# Altium footprint library Binh.PcbLib: 863 footprints (part 23 of 54)
Each footprint in its own frame and in the unit in brackets; x right, y up, seen from the top. Pads: shape width x height; smd on the part's side, far side on the other; paste and mask are expansions set on the pad; w line width, h text height; cw(c..) or ccw(c..) is an arc to the next point about the centre after c.
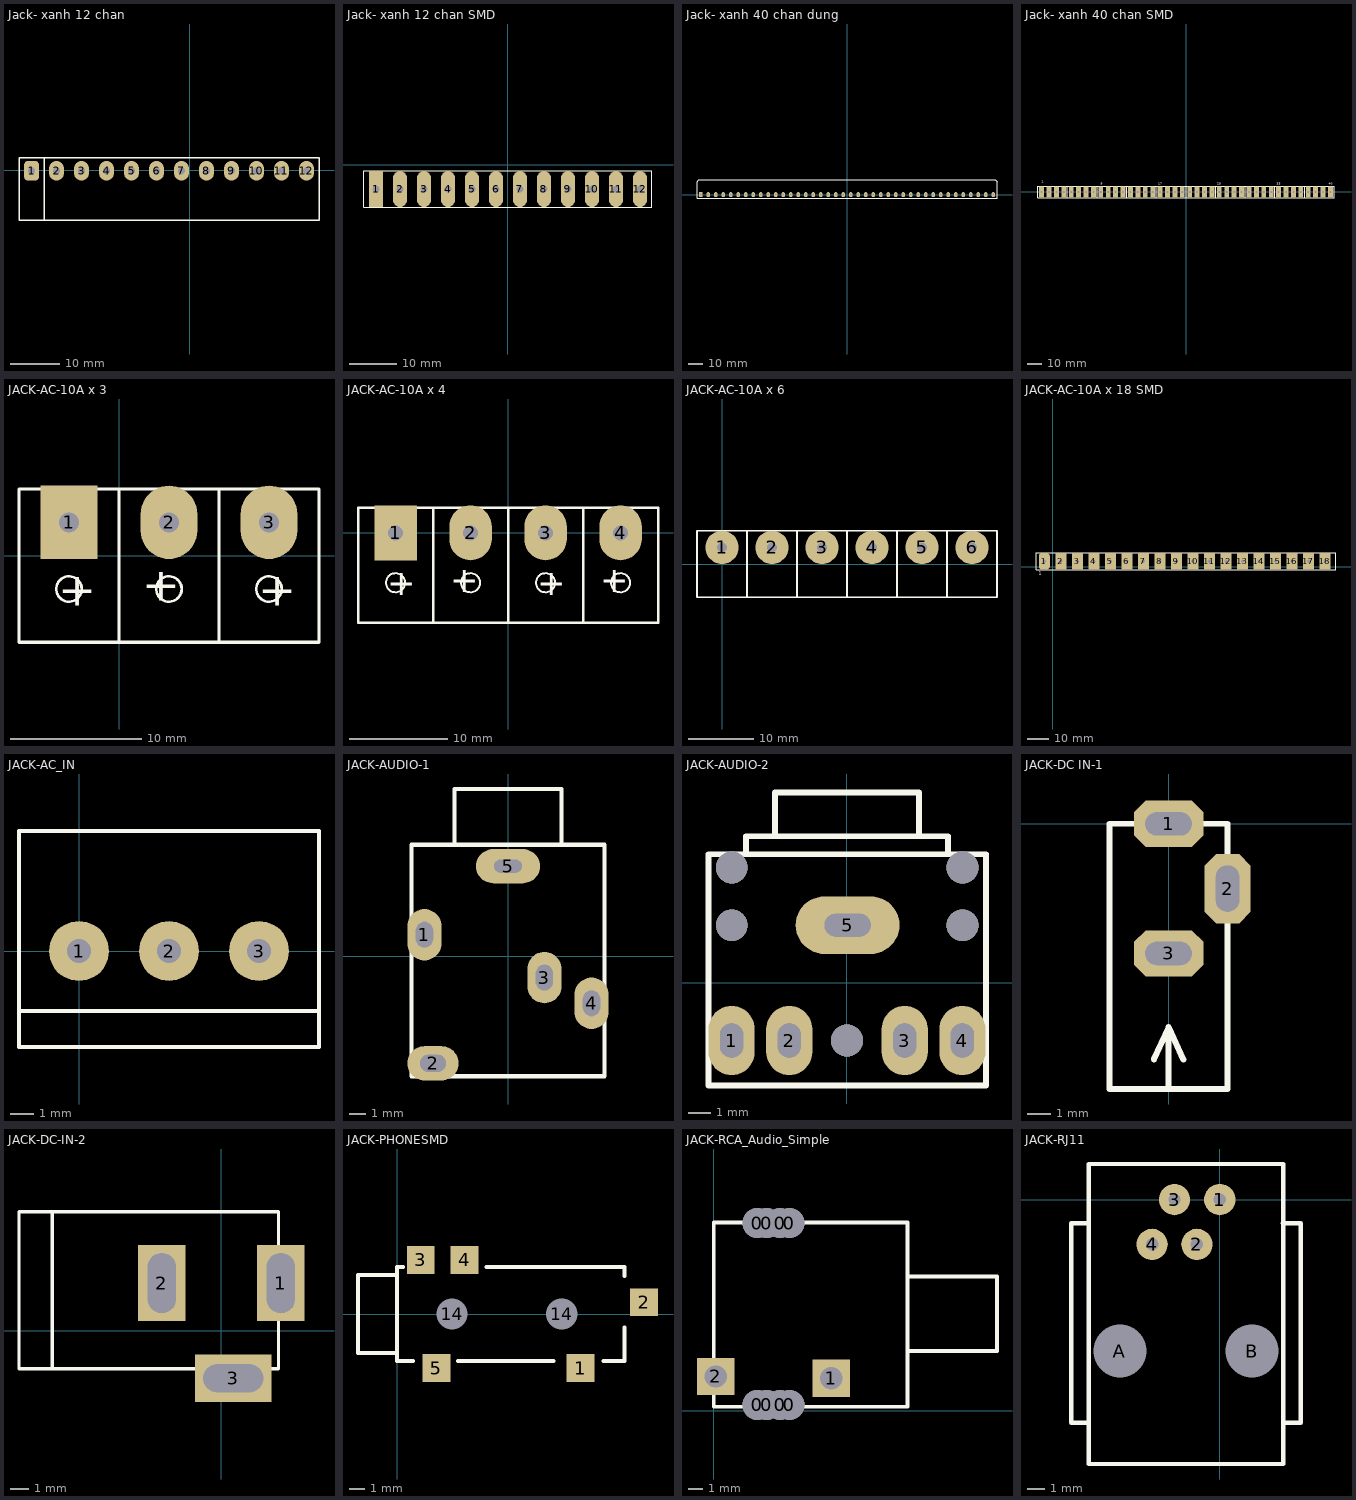
[diagram p22: the footprints below, top view; thin cyan lines are the x and y axes]

## Jack- xanh 12 chan [mm] "Jac xanh duc"
pads (12):
  rrect50% 3x4 hole 1.5: 1(-32.131,-0.127)
  oval 3x4 hole 1.5: 2(-27.063,-0.127) 3(-21.994,-0.127) 4(-16.926,-0.127) 5(-11.857,-0.127) 6(-6.789,-0.127) 7(-1.72,-0.127) 8(3.348,-0.127) 9(8.417,-0.127) 10(13.485,-0.127) 11(18.554,-0.127) 12(23.622,-0.127)
Top Overlay:
  lines w0.254: -29.591,-10.16 -29.591,2.413 ; -34.671,-10.16 -34.671,2.54 26.162,2.54 26.162,-10.16 -34.671,-10.16

## Jack- xanh 12 chan SMD [mm] "Jac xanh duc"
pads (12):
  rect 3x7.62 hole 1.5: 1(-27.871,-5.08)
  oval 3x7.62 hole 1.5: 2(-22.802,-5.08) 3(-17.734,-5.08) 4(-12.665,-5.08) 5(-7.597,-5.08) 6(-2.528,-5.08) 7(2.54,-5.08) 8(7.608,-5.08) 9(12.677,-5.08) 10(17.745,-5.08) 11(22.814,-5.08) 12(27.882,-5.08)
Top Overlay:
  lines w0.254: -30.422,-8.89 -30.422,-1.27 30.411,-1.27 30.411,-8.89 -30.422,-8.89

## Jack- xanh 40 chan dung [mil] "Jac xanh duc"
height 200
pads (40):
  rect 100x130 hole 50: 1(-3900,0)
  oval 100x130 hole 50: 2(-3700,0) 3(-3500,0) 4(-3300,0) 5(-3100,0) 6(-2900,0) 7(-2700,0) 8(-2500,0) 9(-2300,0) 10(-2100,0) 11(-1900,0) 12(-1700,0) 13(-1500,0) 14(-1300,0) 15(-1100,0) 16(-900,0) 17(-700,0) 18(-500,0) 19(-300,0) 20(-100,0) 21(100,0) 22(300,0) 23(500,0) 24(700,0) 25(900,0) 26(1100,0) 27(1300,0) 28(1500,0) 29(1700,0) 30(1900,0) 31(2100,0) 32(2300,0) 33(2500,0) 34(2700,0) 35(2900,0) 36(3100,0) 37(3300,0) 38(3500,0) 39(3700,0) 40(3900,0)
Top Overlay:
  lines w13: -4000,-100 4000,-100 4000,350 3950,400 -3950,400 -4000,350 -4000,-100

## Jack- xanh 40 chan SMD [mil] "Jac xanh duc"
pads (40):
  rect 130x300 hole 60: 1(-3900,0) 2(-3700,0) 3(-3500,0) 4(-3300,0) 5(-3100,0) 6(-2900,0) 7(-2700,0) 8(-2500,0) 9(-2300,0) 10(-2100,0) 11(-1900,0) 12(-1700,0) 13(-1500,0) 14(-1300,0) 15(-1100,0) 16(-900,0) 17(-700,0) 18(-500,0) 19(-300,0) 20(-100,0) 21(100,0) 22(300,0) 23(500,0) 24(700,0) 25(900,0) 26(1100,0) 27(1300,0) 28(1500,0) 29(1700,0) 30(1900,0) 31(2100,0) 32(2300,0) 33(2500,0) 34(2700,0) 35(2900,0) 36(3100,0) 37(3300,0) 38(3500,0) 39(3700,0) 40(3900,0)
Top Overlay:
  lines w10: -3200,-150 -3200,150 ; -2400,-150 -2400,150 ; -800,-150 -800,150 ; 0,-150 0,150 ; 800,-150 800,150 ; 1600,-150 1600,150 ; 2400,-150 2400,150 ; 3200,-150 3200,150 ; -1602.73,-150 4000,-150 4000,150 -1602.73,150 ; -1602.73,-150 -1602.73,150 ; -1602.73,-150 -3997.73,-150 -3997.73,150 -1602.73,150
  text "40" at 3850,200 h60
  text "33" at 2450,200 h60
  text "25" at 850,200 h60
  text "17" at -750,200 h60
  text "9" at -2300,200 h60
  text "1" at -3900,250 h60

## JACK-AC-10A x 3 [mil] "Jac nguon 220V 10A"
pads (3):
  rect 170x220 hole 60: 1(-150,100)
  oval 170x220 hole 60: 2(150,100) 3(450,100)
Top Overlay:
  circle w8: c-150,-100 r38.08
  circle w8: c150,-100 r38.08
  circle w8: c450,-100 r38.08
  lines w10: 0,-260 0,200 ; 300,-260 300,-200 ; 300,-260 -300,-260 -300,200 300,200 ; 300,-260 300,200 ; 300,-260 600,-260 600,200 300,200 ; 300,-200 300,200 ; 300,-200 300,200
  text "+" at -183,-150 h100
  text "+" at 183,-50 h100
  text "+" at 417,-150 h100

## JACK-AC-10A x 4 [mil] "Jac nguon 220V 10A"
pads (4):
  rect 170x220 hole 60: 1(-450,0)
  oval 170x220 hole 60: 2(-150,0) 3(150,0) 4(450,0)
Top Overlay:
  circle w8: c-450,-200 r38.08
  circle w8: c-150,-200 r38.08
  circle w8: c150,-200 r38.08
  circle w8: c450,-200 r38.08
  lines w10: -300,-360 -300,100 ; 300,-360 300,100 ; 0,-360 0,-300 ; 0,-360 -600,-360 -600,100 0,100 ; 0,-360 0,100 ; 0,-360 600,-360 600,-300 ; 0,-300 0,100 ; 0,-300 0,100 ; 0,100 600,100 ; 600,-300 600,100 ; 600,-300 600,100
  text "+" at -483,-250 h100
  text "+" at -117,-150 h100
  text "+" at 117,-250 h100
  text "+" at 483,-150 h100

## JACK-AC-10A x 6 [mil] "Jac nguon 220V 10A"
pads (6):
  round 200 hole 60: 1(0,100) 2(300,100) 3(600,100) 4(900,100) 5(1200,100) 6(1500,100)
Top Overlay:
  lines w10: 150,-200 150,200 ; 750,-200 750,200 ; 1350,-200 1350,200 ; 450,-200 1050,-200 ; 450,-200 450,200 ; 450,-200 450,200 ; 450,-200 -150,-200 -150,200 450,200 ; 450,200 1050,200 ; 1050,-200 1050,200 ; 1050,-200 1050,200 ; 1050,-200 1650,-200 1650,200 1050,200 ; 1050,-200 1050,200

## JACK-AC-10A x 18 SMD [mil] "Jac nguon 220V 10A"
pads (18):
  rrect50% 200x300 hole 60: 1(-150,100)
  rect 200x300 hole 60: 2(150,100) 3(450,100) 4(750,100) 5(1050,100) 6(1350,100) 7(1650,100) 8(1950,100) 9(2250,100) 10(2550,100) 11(2850,100) 12(3150,100) 13(3450,100) 14(3750,100) 15(4050,100) 16(4350,100) 17(4650,100) 18(4950,100)
Top Overlay:
  lines w10: -300,-50 -300,250 5150,250 5150,-50 -300,-50
  text "1" at -250,-150 h60

## JACK-AC_IN [mil] "AC_Input"
height 3
pads (3):
  round 100 hole 40 square: 1(0,0) 2(150,0) 3(300,0)
Top Overlay:
  lines w7: -100,-100 400,-100 ; -100,-160 400,-160 400,200 -100,200 -100,-160

## JACK-AUDIO-1 [mil] "Jac Phone Stereo"
pads (5):
  oval 80x120 hole 40 slot 60 at 90 deg: 1(-195,50) 3(85,-50) 4(195,-110)
  oval 120x80 hole 40 slot 60 at 0 deg: 2(-175,-250)
  oval 150x80 hole 30 slot 65 at 0 deg: 5(0,210)
Top Overlay:
  lines w10: -125,262 -125,390 125,390 125,262 ; 223,-280 -225,-280 ; -225,-280 -225,260 ; -225,-280 -225,260 ; -225,260 225,260 ; 225,260 225,-280 225,260

## JACK-AUDIO-2 [mil] "Jac Phone Stereo"
pads (5):
  oval 80x120 hole 40 slot 60 at 90 deg: 1(-200,-100) 2(-100,-100) 3(100,-100) 4(200,-100)
  oval 180x100 hole 40 slot 80 at 0 deg: 5(1,100)
via -200,200 diameter 55 hole 55
via 200,200 diameter 55 hole 55
via 0,-100 diameter 55 hole 55
via -200,100 diameter 55 hole 55
via 200,100 diameter 55 hole 55
Top Overlay:
  lines w10: -240,219 -240,-178 ; -175,224 -175,254 175,254 175,226 174,225 ; -125,255 -125,330 125,330 ; 125,329 125,256 126,255 ; 240,-178 -240,-178 ; -240,-178 241,-178 241,223 -240,223 -240,-178
3D body "SW3dPS-CONNECTOR, PHONE JACK, STEREO, 3.5 MM, SEE-PLUS ST-3536-02HG.STEP": height 394.3, standoff -137.19, extent -239,-201.56 233.44,353.56

## JACK-DC IN-1 [mm] "Power Header 3mm"
pads (3):
  oct 3x2 hole 1 slot 2 at 0 deg paste+1: 1(0,0) 3(0,-5.588)
  oct 2x3 hole 1 slot 2 at 90 deg paste+1: 2(2.54,-2.794)
Top Overlay:
  lines w0.254: -0.635,-10.16 0,-8.763 ; 0,-11.43 0,-8.763 ; 0.635,-10.16 0,-8.763 ; -2.54,-11.43 2.54,-11.43 2.54,0 -2.54,0 -2.54,-11.43

## JACK-DC-IN-2 [mil] "Jac DC input"
height 200
pads (3):
  rect 100x160 hole 59.06 slot 125.98 at 90 deg: 1(125,100) 2(-125,100)
  rect 160x100 hole 59.06 slot 125.98 at 0 deg: 3(25,-100)
Top Overlay:
  lines w7: -355,-80 -355,250 ; -425,-80 -425,250 120,250 120,-80 -425,-80
3D body "SW3dPS-dc range - dc connector[4840.2201].STEP": height 433.67, standoff -137.2, extent -410.35,-105.12 134,269.12

## JACK-PHONESMD [mil]
pads (7):
  rect 70x70 smd: 1(460.63,-135.83) 2(620.08,29.53) 3(59.05,135.83) 4(169.29,135.83) 5(98.43,-135.83)
  round 70 hole 78.74 unplated: 14(137.79,0) 14(413.39,0)
Top Overlay:
  lines w10: 0,-98.43 -98.43,-98.43 -98.43,98.43 0,98.43 ; 15,118.11 0,118.11 0,-118.11 40,-118.11 ; 153.11,-118.11 393.11,-118.11 ; 224.41,118.11 570.87,118.11 570.87,95.87 ; 518.11,-118.11 570.87,-118.11 570.87,-34.13

## JACK-RCA_Audio_Simple [mm] "Connecter Audio"
pads (10):
  round 2 hole 2: 0(2.921,0.381) 0(2.921,12.573) 0(3.556,0.381) 0(3.556,12.573) 0(4.445,0.381) 0(4.445,12.573) 0(5.08,0.381) 0(5.08,12.573)
  rect 2.5x2.5 hole 1.5: 1(7.874,2.159) 2(0.127,2.286)
Top Overlay:
  lines w0.254: 13,4 19,4 19,9 13,9 ; 0,0.254 0,12.619 13,12.619 13,0.254 0,0.254

## JACK-RJ11 [mil]
pads (6):
  round 70 hole 27.56 unplated: 1(0,0) 2(-51,-100) 3(-101,0) 4(-151,-100)
  round 70 hole 118.11 unplated: A(-223,-337.7) B(72.28,-337.7)
Top Overlay:
  lines w10: -291.9,-497.7 -331.27,-497.7 -331.27,-52.7 -291.9,-52.7 ; 140,-52.7 180.54,-52.7 180.54,-497.7 141.17,-497.7 ; -291.9,-589.55 141.17,-589.55 141.17,79.3 -291.9,79.3 -291.9,-589.55